# Altium footprint library lib_protel_HC_BOINA.PCBLIB: 726 footprints (part 36 of 46)
Each footprint in its own frame and in the unit in brackets; x right, y up, seen from the top. Pads: shape width x height; smd on the part's side, far side on the other; paste and mask are expansions set on the pad; w line width, h text height; cw(c..) or ccw(c..) is an arc to the next point about the centre after c.
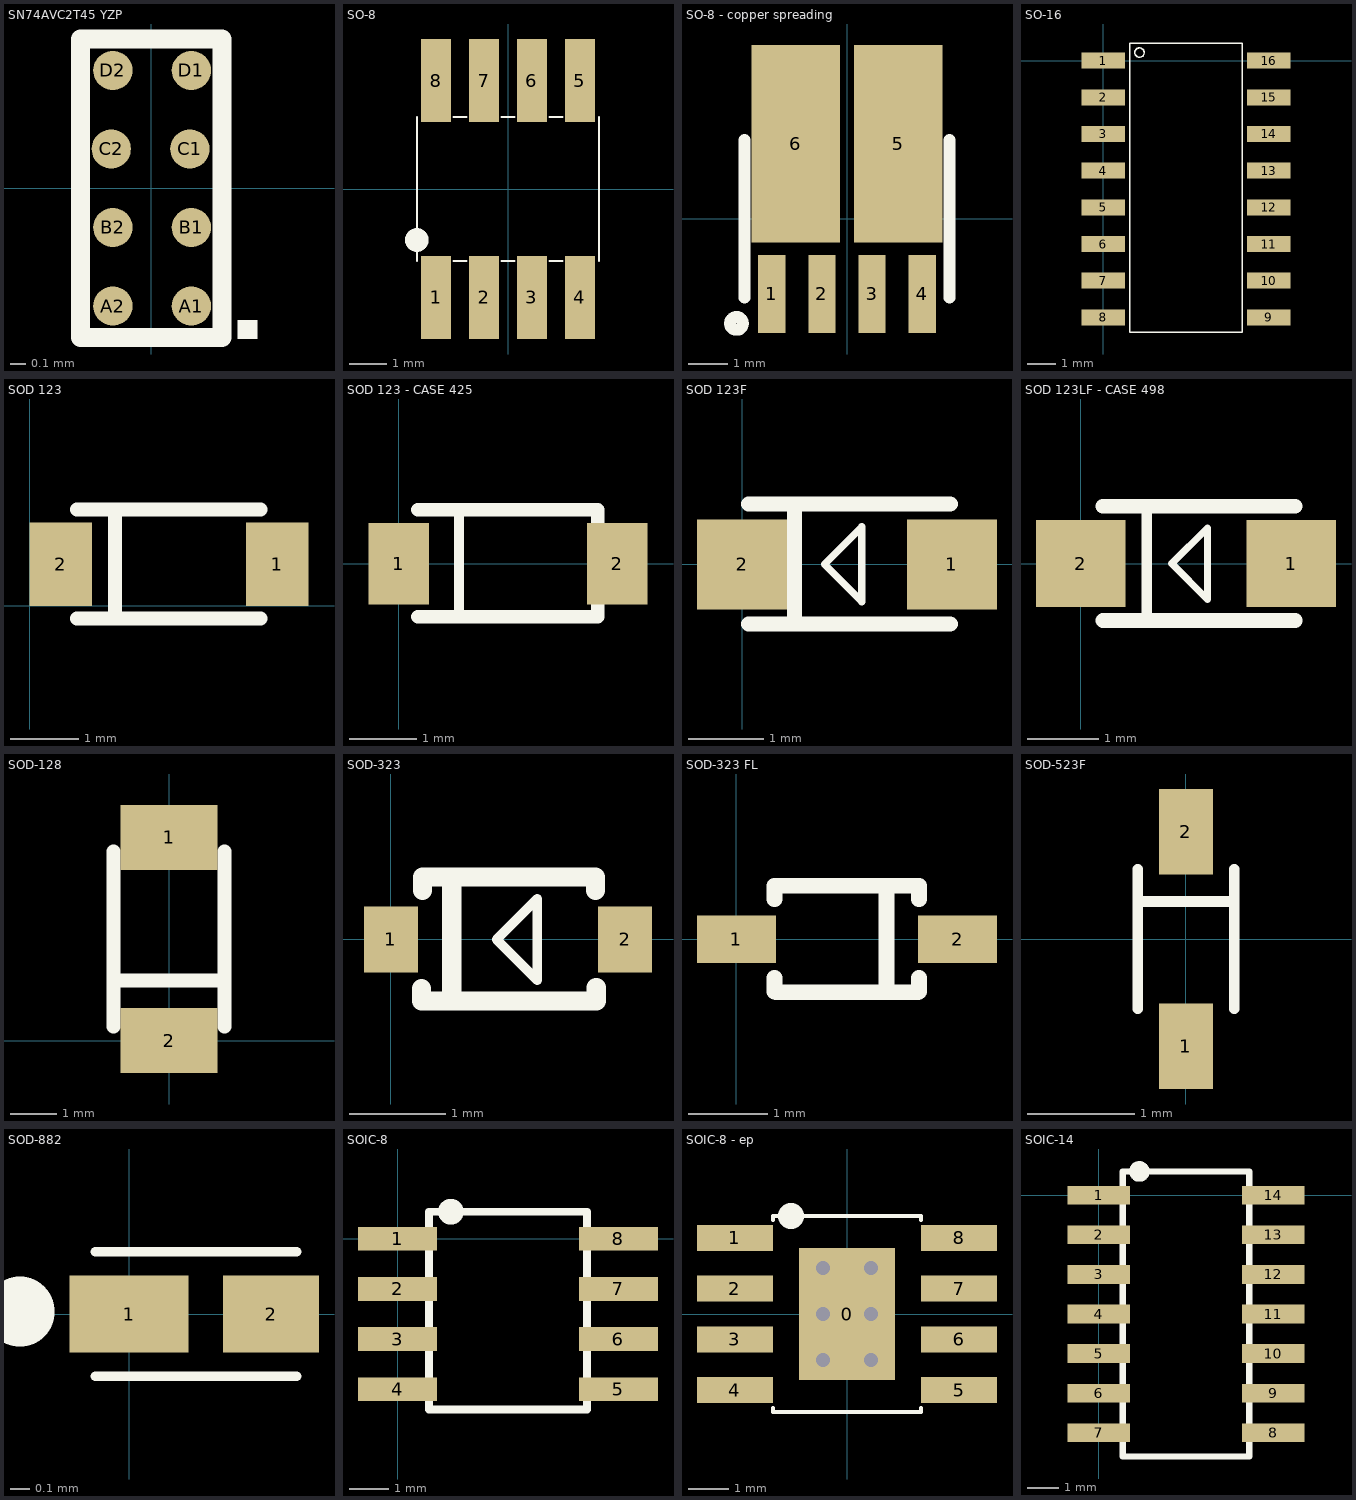
[diagram p35: the footprints below, top view; thin cyan lines are the x and y axes]

## SN74AVC2T45 YZP [mm] "SN74AVC2T45"
height 0.5
pads (8):
  round 0.25 smd mask+0.025: A1(0.255,-0.75) A2(-0.245,-0.75) B1(0.255,-0.25) B2(-0.245,-0.25) C1(0.245,0.25) C2(-0.255,0.25) D1(0.255,0.75) D2(-0.245,0.75)
Top Overlay:
  rectangle: 0.55,-0.96 0.675,-0.84
  lines w0.12: -0.45,-0.95 -0.45,0.95 0.45,0.95 0.45,-0.95 -0.45,-0.95

## SO-8 [mm]
height 1.65
pads (8):
  rect 0.8x2.2 smd mask+0.1: 1(-1.905,-2.87) 2(-0.635,-2.87) 3(0.635,-2.87) 4(1.905,-2.87) 5(1.905,2.87) 6(0.635,2.87) 7(-0.635,2.87) 8(-1.905,2.87)
Top Overlay:
  circle w0.3: c-2.413,-1.35 r0.163
  lines w0.051: -2.413,-1.905 -2.413,1.905 ; -1.448,-1.905 -1.092,-1.905 ; -1.448,1.905 -1.092,1.905 ; -0.178,-1.905 0.178,-1.905 ; -0.178,1.905 0.178,1.905 ; 1.092,-1.905 1.448,-1.905 ; 1.092,1.905 1.448,1.905 ; 2.413,-1.905 2.413,1.905

## SO-8 - copper spreading [mm]
height 1.65
pads (6):
  rect 0.69x1.98 smd mask+0.1: 1(-1.905,-1.905) 2(-0.635,-1.905) 3(0.635,-1.905) 4(1.905,-1.905)
  rect 2.25x5 smd mask+0.1: 5(1.3,1.905) 6(-1.3,1.905)
Top Overlay:
  circle w0.3: c-2.8,-2.65 r0.163
  lines w0.3: -2.6,-2 -2.6,2 ; 2.6,-2 2.6,2

## SO-16 [mm]
height 1.75
pads (16):
  rect 1.5x0.55 smd mask+0.1: 1(0,0) 2(0,-1.27) 3(0,-2.54) 4(0,-3.81) 5(0,-5.08) 6(0,-6.35) 7(0,-7.62) 8(0,-8.89) 9(5.74,-8.89) 10(5.74,-7.62) 11(5.74,-6.35) 12(5.74,-5.08) 13(5.74,-3.81) 14(5.74,-2.54) 15(5.74,-1.27) 16(5.74,0)
Top Overlay:
  circle w0.051: c1.26,0.279 r0.163
  lines w0.051: 0.914,-9.398 4.826,-9.398 4.826,0.61 0.914,0.61 0.914,-9.398

## SOD 123 [mm]
height 1.17
pads (2):
  rect 0.91x1.22 smd: 1(3.625,0.61) 2(0.455,0.61)
Top Overlay:
  lines w0.203: 0.693,-0.186 3.383,-0.186 ; 0.693,1.414 3.383,1.414 ; 1.25,-0.15 1.25,1.4

## SOD 123 - CASE 425 [mm] "DIODO"
height 1.17
pads (2):
  rect 0.91x1.22 smd: 1(0,0) 2(3.27,0)
Top Overlay:
  lines w0.152: 0.9,-0.82 0.9,0.81
  lines w0.203: 0.288,-0.796 2.978,-0.796 2.978,0.804 0.288,0.804

## SOD 123F [mm] "DIODO"
height 0.98
pads (2):
  rect 1.2x1.2 smd: 1(2.8,0) 2(0,0)
Top Overlay:
  lines w0.1: 1.1,0 1.6,0.5 1.6,-0.5 1.1,0
  lines w0.2: 0.7,-0.796 0.7,0.75
  lines w0.203: 0.088,-0.796 2.778,-0.796 ; 0.088,0.804 2.778,0.804

## SOD 123LF - CASE 498 [mm] "DIODO"
height 0.95
pads (2):
  rect 1.25x1.22 smd: 1(2.95,0) 2(0,0)
Top Overlay:
  lines w0.1: 1.275,0 1.775,-0.5 1.775,0.5 1.275,0
  lines w0.152: 0.925,-0.82 0.925,0.81
  lines w0.203: 0.313,-0.796 3.003,-0.796 ; 0.313,0.804 3.003,0.804

## SOD-128 [mm]
height 0.85
pads (2):
  rect 2.1x1.4 smd: 1(0,4.4) 2(0,0)
Top Overlay:
  lines w0.3: -1.2,0.3 -1.2,4.1 ; -1.2,1.3 1.2,1.3 ; 1.2,0.3 1.2,4.1
3D body "User Library-SOD-128 ST214 model.step": height 1.11, standoff 0, extent -1.35,-0.4 1.35,4.8

## SOD-323 [mil] "DIODO"
height 45
pads (2):
  rect 22x27 smd: 1(0,0) 2(96,0)
Top Overlay:
  lines w3.94: 43.31,0 60.04,-16.73 60.04,16.73 43.31,0
  lines w7.87: 12.57,-20.08 12.57,-25.2 84.22,-25.2 84.22,-19.68 ; 12.96,20.08 12.96,25.2 ; 12.96,25.59 83.83,25.59 ; 24.97,-22.24 24.97,25 ; 83.83,20.08 83.83,25.2

## SOD-323 FL [mm] "DIODO"
height 1.1
pads (2):
  rect 1x0.6 smd: 1(0,0) 2(2.8,0)
Top Overlay:
  lines w0.2: 0.483,-0.66 0.483,-0.488 ; 0.483,0.508 0.483,0.68 2.3,0.68 ; 0.5,-0.67 2.3,-0.67 ; 1.9,-0.65 1.9,0.67 ; 2.311,-0.66 2.311,-0.488 ; 2.311,0.508 2.311,0.68

## SOD-523F [mm] "1N4148 SOD-523F"
height 0.7
pads (2):
  rect 0.5x0.8 smd: 1(0,-1) 2(0,1)
Top Overlay:
  lines w0.1: -0.45,-0.65 -0.45,0.65 ; -0.45,0.35 0.45,0.35 ; 0.45,-0.65 0.45,0.65

## SOD-882 [mm]
pads (2):
  rect 0.62x0.4 smd mask+0.05: 1(0,0)
  rect 0.5x0.4 smd mask+0.05: 2(0.74,0)
Top Overlay:
  circle w0.356: c-0.569,0.013 r0.004
  lines w0.05: -0.175,-0.325 0.875,-0.325 ; -0.175,0.325 0.875,0.325
3D body: height 0.55, standoff 0, extent -0.175,-0.325 0.875,0.325

## SOIC-8 [mm]
pads (8):
  rect 2x0.6 smd: 1(0,0) 2(0,-1.27) 3(0,-2.54) 4(0,-3.81) 5(5.588,-3.81) 6(5.588,-2.54) 7(5.588,-1.27) 8(5.588,0)
Top Overlay:
  circle w0.508: c1.35,0.682 r0.071
  lines w0.2: 0.794,-4.318 4.794,-4.318 4.794,0.682 0.794,0.682 0.794,-4.318

## SOIC-8 - ep [mm]
pads (9):
  rect 2.41x3.3 smd: 0(0,0)
  rect 1.9x0.65 smd: 1(-2.8,1.905) 2(-2.8,0.635) 3(-2.8,-0.635) 4(-2.8,-1.905) 5(2.8,-1.905) 6(2.8,-0.635) 7(2.8,0.635) 8(2.8,1.905)
via -0.6,0 diameter 0.8 hole 0.35
via 0.6,0 diameter 0.8 hole 0.35
via 0.6,1.15 diameter 0.8 hole 0.35
via -0.6,1.15 diameter 0.8 hole 0.35
via 0.6,-1.15 diameter 0.8 hole 0.35
via -0.6,-1.15 diameter 0.8 hole 0.35
Top Overlay:
  circle w0.508: c-1.4,2.45 r0.071
  lines w0.1: -1.85,-2.35 -1.85,-2.45 1.85,-2.45 1.85,-2.35 ; -1.85,2.35 -1.85,2.45 1.85,2.45 1.85,2.35

## SOIC-14 [mm]
height 1
pads (14):
  rect 2x0.6 smd: 1(0,0) 2(0,-1.27) 3(0,-2.54) 4(0,-3.81) 5(0,-5.08) 6(0,-6.35) 7(0,-7.62) 8(5.588,-7.62) 9(5.588,-6.35) 10(5.588,-5.08) 11(5.588,-3.81) 12(5.588,-2.54) 13(5.588,-1.27) 14(5.588,0)
Top Overlay:
  lines w0.2: 0.762,-8.382 4.826,-8.382 4.826,0.762 0.762,0.762 0.762,-8.382
  lines w0.254: 1.469,0.875 ccw(c1.3,0.762) 1.482,0.853
3D body "User Library-so14-1.STEP": height 1.7, standoff 0, extent -0.2,-8.2 5.8,0.6